# Altium footprint library ThanhNT.PcbLib: 579 footprints (part 19 of 37)
Each footprint in its own frame and in the unit in brackets; x right, y up, seen from the top. Pads: shape width x height; smd on the part's side, far side on the other; paste and mask are expansions set on the pad; w line width, h text height; cw(c..) or ccw(c..) is an arc to the next point about the centre after c.
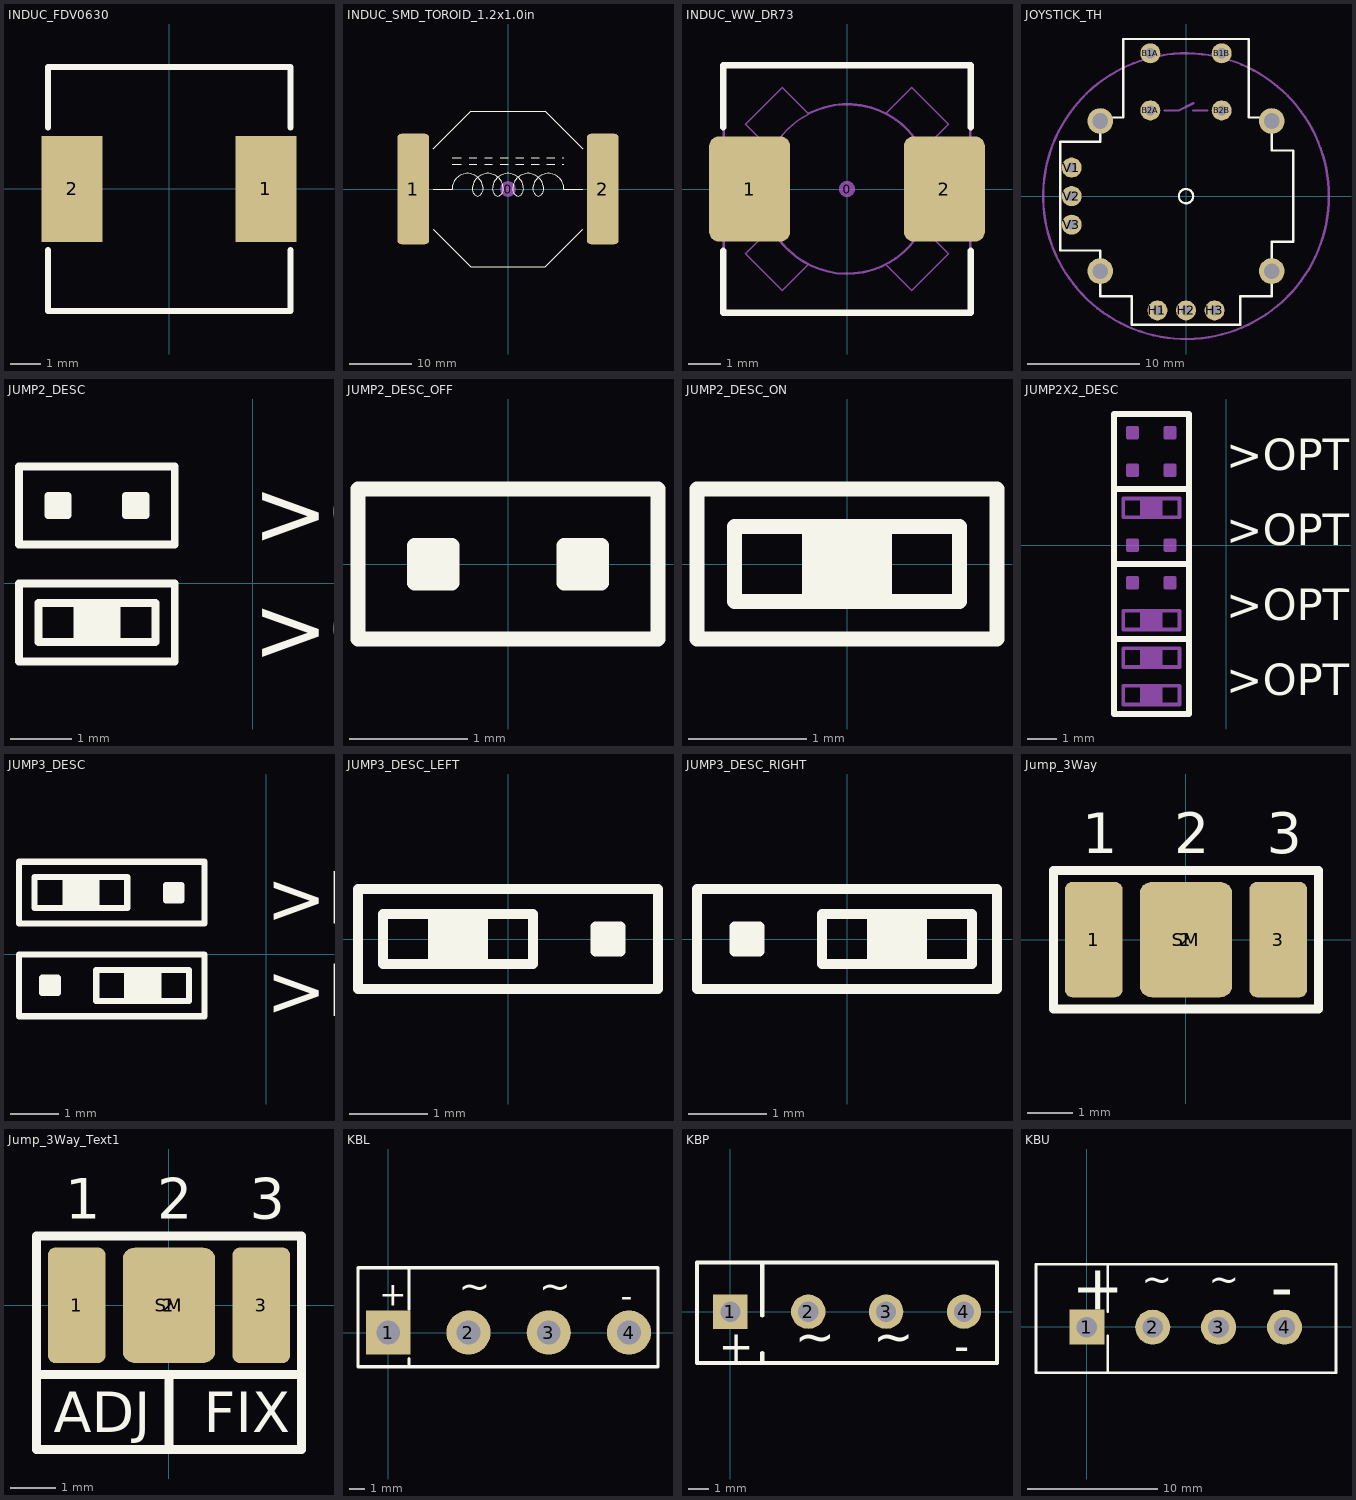
[diagram p18: the footprints below, top view; thin cyan lines are the x and y axes]

## INDUC_FDV0630 [mm]
pads (2):
  rect 2x3.5 smd: 1(3.2,0) 2(-3.2,0)
Top Overlay:
  lines w0.2: -3.997,-2.025 -3.997,-4.025 4.003,-4.025 4.003,-2.025 ; -3.997,2.025 -3.997,4.013 4.003,4.013 4.003,2.025

## INDUC_SMD_TOROID_1.2x1.0in [mm] "Inductor, Toroid, 30.5mm L x 25.4mm W x 13.5mm T"
height 13.5
pads (3):
  round 2.54 on Mech15: 0(0,0)
  rrect25% 5.1x17.8 smd: 1(-15.25,0) 2(15.25,0)
Top Overlay:
  lines w0.2: -12,-6.5 -6,-12.5 6,-12.5 12,-6.5 ; -12,0 -9,0 cw(c-6.5,0) -4,0 cw(c-5.25,0) -4.691,-1.118 cw(c-4.875,0) -5.059,-1.118 cw(c-4.5,0) -5.75,0 cw(c-3.25,0) -0.75,0 cw(c-2,0) -1.441,-1.118 cw(c-1.625,0) -1.809,-1.118 cw(c-1.25,0) -2.5,0 cw(c0,0) 2.5,0 cw(c1.25,0) 1.809,-1.118 cw(c1.625,0) 1.441,-1.118 cw(c2,0) 0.75,0 cw(c3.25,0) 5.75,0 cw(c4.5,0) 5.059,-1.118 cw(c4.875,0) 4.691,-1.118 cw(c5.25,0) 4,0 cw(c6.5,0) 9,0 12,0 ; -12,6.5 -6,12.5 6,12.5 12,6.5 ; -9,4 -7.5,4 ; -9,5 -7.5,5 ; -6.25,4 -5,4 ; -6.25,5 -5,5 ; -3.75,4 -2.5,4 ; -3.75,5 -2.5,5 ; -1.25,4 0,4 ; -1.25,5 0,5 ; 1.25,4 2.5,4 ; 1.25,5 2.5,5 ; 3.75,4 5,4 ; 3.75,5 5,5 ; 6.25,4 7.5,4 ; 6.25,5 7.5,5 ; 8.75,4 9,4 ; 8.75,5 9,5
3D body: height 3.5, standoff 1.5, extent -17,-12.5 17,12.5
3D body: height 12, standoff 5, extent -10,-10 10,10

## INDUC_WW_DR73 [mm] "Wire-wound power inductor, Cooper Bussmann DR73 series, IPC Medium Density"
height 3.55
pads (3):
  round 0.5 on Mech15: 0(0,0)
  rrect25% 2.5x3.25 smd: 1(-3,0) 2(3,0)
Top Overlay:
  lines w0.2: -3.81,-1.905 -3.81,-3.81 3.81,-3.81 3.81,-1.905 ; -3.81,1.905 -3.81,3.81 3.81,3.81 3.81,1.905
Mechanical 13:
  circle w0.05: c0,0 r2.6
  lines w0.05: -2.574,-0.515 -2.574,-0.367 ; -2.574,0.367 -2.574,0.515 ; -2.346,-1.178 -2.346,-1.121 ; -2.346,1.121 -2.346,1.178 ; -2.273,-1.263 -2.334,-1.202 -3.129,-1.998 -1.998,-3.129 -1.202,-2.334 ; -2.273,1.263 -2.334,1.202 ; -2.202,-1.429 -2.184,-1.411 ; -2.202,1.429 -2.184,1.411 ; -1.429,-2.202 -1.411,-2.184 ; -1.263,-2.273 -1.202,-2.334 ; -1.197,-2.308 -1.202,-2.334 ; -0.237,2.589 -0.232,2.615 ; 0.232,-2.615 0.237,-2.589 ; 1.197,2.308 1.202,2.334 ; 1.202,-2.334 1.998,-3.129 3.129,-1.998 2.334,-1.202 2.273,-1.263 ; 1.263,2.273 1.202,2.334 ; 1.411,2.184 1.429,2.202 ; 2.184,-1.411 2.202,-1.429 ; 2.184,1.411 2.202,1.429 ; 2.273,1.263 2.334,1.202 3.129,1.998 1.998,3.129 1.202,2.334 ; 2.574,-0.515 2.574,-0.367 ; 2.574,0.367 2.574,0.515 ; -2.334,1.202 ccw(c0,0) -1.202,2.334 -1.998,3.129 -3.129,1.998 -2.334,1.202 ; -3.8,-3.8 3.8,-3.8 3.8,3.8 -3.8,3.8 -3.8,-3.8
Mechanical 15:
  lines w0.076: -3.8,-3.8 -3.8,3.8 3.8,3.8 3.8,-3.8 -3.8,-3.8
3D body "Cooper Bussman DR73 Series Inductor.STEP": height 3.55, standoff 0, extent -3.8,-3.8 3.8,3.8

## JOYSTICK_TH [mil]
pads (14):
  round 70 hole 36: B1A(-125,500) B1B(125,500) B2A(-125,300) B2B(125,300)
  round 70 hole 35: H1(-100,-400) H2(0,-400) H3(100,-400) V1(-400,100) V2(-400,0) V3(-400,-100)
  round 90 hole 55: MOUNT1(-300,263) MOUNT2(-300,-262.5) MOUNT3(300,-262.5) MOUNT4(300,263)
Top Overlay:
  circle w7.87: c0,0 r25
  lines w7.87: -440,-190 -300,-190 -300,-350 -190,-350 -190,-450 190,-450 190,-350 300,-350 300,-160 375,-160 375,160 300,160 300,275 220,275 220,550 -220,550 -220,275 -300,275 -300,190 -440,190 -440,-190
Mechanical 16:
  circle w8: c0,0 r500
  lines w8: -75,300 -25,300 25,325 ; 25,300 75,300
3D body "User Library-ALPS JOYSTICK.STEP": height 111.55, standoff -1218.58, extent -520,-518.58 515.43,624.58

## JUMP2_DESC [mm]
Top Overlay:
  lines w0.127: -3.334,1.143 -3.334,1.27 ; -3.334,1.143 -3.016,1.143 ; -3.334,1.143 -3.334,1.111 -3.016,1.111 -3.016,1.143 ; -3.334,1.27 -3.016,1.27 ; -3.334,1.27 -3.334,1.397 ; -3.334,1.397 -3.016,1.397 ; -3.334,1.397 -3.334,1.429 -3.016,1.429 -3.016,1.397 ; -3.016,1.143 -3.016,1.27 ; -3.016,1.27 -3.016,1.397 ; -2.857,-0.889 -2.222,-0.889 ; -2.857,-0.889 -2.857,-0.762 ; -2.857,-0.889 -2.857,-0.953 -2.222,-0.953 -2.222,-0.889 ; -2.857,-0.762 -2.857,-0.635 ; -2.857,-0.762 -2.222,-0.762 ; -2.857,-0.635 -2.222,-0.635 ; -2.857,-0.635 -2.857,-0.508 ; -2.857,-0.508 -2.222,-0.508 ; -2.857,-0.508 -2.857,-0.381 ; -2.857,-0.381 -2.222,-0.381 ; -2.857,-0.381 -2.857,-0.318 -2.222,-0.318 -2.222,-0.381 ; -2.222,-0.889 -2.222,-0.762 ; -2.222,-0.762 -2.222,-0.635 ; -2.222,-0.635 -2.222,-0.508 ; -2.222,-0.508 -2.222,-0.381 ; -2.064,1.143 -2.064,1.27 ; -2.064,1.143 -1.746,1.143 ; -2.064,1.143 -2.064,1.111 -1.746,1.111 -1.746,1.143 ; -2.064,1.27 -1.746,1.27 ; -2.064,1.27 -2.064,1.397 ; -2.064,1.397 -1.746,1.397 ; -2.064,1.397 -2.064,1.429 -1.746,1.429 -1.746,1.397 ; -1.746,1.143 -1.746,1.27 ; -1.746,1.27 -1.746,1.397 ; -3.81,-1.27 -1.27,-1.27 -1.27,0 -3.81,0 -3.81,-1.27 ; -3.81,0.635 -3.81,1.905 -1.27,1.905 -1.27,0.635 -3.81,0.635 ; -3.492,-0.953 -1.587,-0.953 -1.587,-0.318 -3.492,-0.318 -3.492,-0.953
  text ">OFF" at 0,0.635 h1.08
  text ">ON" at 0,-1.27 h1.08

## JUMP2_DESC_OFF [mm]
Top Overlay:
  lines w0.127: -0.794,-0.127 -0.794,0 ; -0.794,-0.127 -0.476,-0.127 ; -0.794,-0.127 -0.794,-0.159 -0.476,-0.159 -0.476,-0.127 ; -0.794,0 -0.476,0 ; -0.794,0 -0.794,0.127 ; -0.794,0.127 -0.476,0.127 ; -0.794,0.127 -0.794,0.159 -0.476,0.159 -0.476,0.127 ; -0.476,-0.127 -0.476,0 ; -0.476,0 -0.476,0.127 ; 0.476,-0.127 0.476,0 ; 0.476,-0.127 0.794,-0.127 ; 0.476,-0.127 0.476,-0.159 0.794,-0.159 0.794,-0.127 ; 0.476,0 0.794,0 ; 0.476,0 0.476,0.127 ; 0.476,0.127 0.794,0.127 ; 0.476,0.127 0.476,0.159 0.794,0.159 0.794,0.127 ; 0.794,-0.127 0.794,0 ; 0.794,0 0.794,0.127 ; -1.27,-0.635 -1.27,0.635 1.27,0.635 1.27,-0.635 -1.27,-0.635

## JUMP2_DESC_ON [mm]
Top Overlay:
  lines w0.127: -0.318,-0.254 0.318,-0.254 ; -0.318,-0.254 -0.318,-0.127 ; -0.318,-0.254 -0.318,-0.318 0.318,-0.318 0.318,-0.254 ; -0.318,-0.127 -0.318,0 ; -0.318,-0.127 0.318,-0.127 ; -0.318,0 0.318,0 ; -0.318,0 -0.318,0.127 ; -0.318,0.127 0.318,0.127 ; -0.318,0.127 -0.318,0.254 ; -0.318,0.254 0.318,0.254 ; -0.318,0.254 -0.318,0.318 0.318,0.318 0.318,0.254 ; 0.318,-0.254 0.318,-0.127 ; 0.318,-0.127 0.318,0 ; 0.318,0 0.318,0.127 ; 0.318,0.127 0.318,0.254 ; -1.27,-0.635 1.27,-0.635 1.27,0.635 -1.27,0.635 -1.27,-0.635 ; -0.953,-0.318 0.953,-0.318 0.953,0.318 -0.953,0.318 -0.953,-0.318

## JUMP2X2_DESC [mm]
Top Overlay:
  lines w0.2: -3.81,-3.175 -3.81,-0.635 ; -3.81,-3.175 -1.27,-3.175 ; -3.81,-3.175 -3.81,-5.715 -1.27,-5.715 -1.27,-3.175 ; -3.81,-0.635 -3.81,1.905 ; -3.81,-0.635 -1.27,-0.635 ; -3.81,1.905 -3.81,4.445 -1.27,4.445 -1.27,1.905 ; -3.81,1.905 -1.27,1.905 ; -1.27,-3.175 -1.27,-0.635 ; -1.27,-0.635 -1.27,1.905
  text ">OPT1" at 0,2.54 h1.08
  text ">OPT2" at 0,0 h1.08
  text ">OPT3" at 0,-2.54 h1.08
  text ">OPT4" at 0,-5.08 h1.08
Mechanical 16:
  drawing of 196 lines, arcs and shapes, not listed

## JUMP3_DESC [mm]
Top Overlay:
  lines w0.127: -4.604,-0.762 -4.604,-0.794 -4.286,-0.794 -4.286,-0.762 ; -4.604,-0.762 -4.286,-0.762 ; -4.604,-0.762 -4.604,-0.635 ; -4.604,-0.635 -4.604,-0.508 ; -4.604,-0.635 -4.286,-0.635 ; -4.604,-0.508 -4.604,-0.476 -4.286,-0.476 -4.286,-0.508 ; -4.604,-0.508 -4.286,-0.508 ; -4.286,-0.762 -4.286,-0.635 ; -4.286,-0.635 -4.286,-0.508 ; -4.127,1.016 -4.127,0.953 -3.492,0.953 -3.492,1.016 ; -4.127,1.016 -4.127,1.143 ; -4.127,1.016 -3.492,1.016 ; -4.127,1.143 -3.492,1.143 ; -4.127,1.143 -4.127,1.27 ; -4.127,1.27 -4.127,1.397 ; -4.127,1.27 -3.492,1.27 ; -4.127,1.397 -4.127,1.524 ; -4.127,1.397 -3.492,1.397 ; -4.127,1.524 -4.127,1.587 -3.492,1.587 -3.492,1.524 ; -4.127,1.524 -3.492,1.524 ; -3.492,1.016 -3.492,1.143 ; -3.492,1.143 -3.492,1.27 ; -3.492,1.27 -3.492,1.397 ; -3.492,1.397 -3.492,1.524 ; -2.857,-0.889 -2.857,-0.953 -2.222,-0.953 -2.222,-0.889 ; -2.857,-0.889 -2.857,-0.762 ; -2.857,-0.889 -2.222,-0.889 ; -2.857,-0.762 -2.222,-0.762 ; -2.857,-0.762 -2.857,-0.635 ; -2.857,-0.635 -2.857,-0.508 ; -2.857,-0.635 -2.222,-0.635 ; -2.857,-0.508 -2.857,-0.381 ; -2.857,-0.508 -2.222,-0.508 ; -2.857,-0.381 -2.857,-0.318 -2.222,-0.318 -2.222,-0.381 ; -2.857,-0.381 -2.222,-0.381 ; -2.222,-0.889 -2.222,-0.762 ; -2.222,-0.762 -2.222,-0.635 ; -2.222,-0.635 -2.222,-0.508 ; -2.222,-0.508 -2.222,-0.381 ; -2.064,1.143 -2.064,1.111 -1.746,1.111 -1.746,1.143 ; -2.064,1.143 -1.746,1.143 ; -2.064,1.143 -2.064,1.27 ; -2.064,1.27 -2.064,1.397 ; -2.064,1.27 -1.746,1.27 ; -2.064,1.397 -2.064,1.429 -1.746,1.429 -1.746,1.397 ; -2.064,1.397 -1.746,1.397 ; -1.746,1.143 -1.746,1.27 ; -1.746,1.27 -1.746,1.397 ; -5.08,-1.27 -5.08,0 -1.27,0 -1.27,-1.27 -5.08,-1.27 ; -5.08,0.635 -1.27,0.635 -1.27,1.905 -5.08,1.905 -5.08,0.635 ; -4.763,0.953 -2.857,0.953 -2.857,1.587 -4.763,1.587 -4.763,0.953 ; -3.492,-0.953 -3.492,-0.318 -1.587,-0.318 -1.587,-0.953 -3.492,-0.953
  text ">RIGHT" at 0,-1.27 h1.08
  text ">LEFT" at 0,0.635 h1.08

## JUMP3_DESC_LEFT [mm]
Top Overlay:
  lines w0.127: -0.953,-0.254 -0.953,-0.318 -0.318,-0.318 -0.318,-0.254 ; -0.953,-0.254 -0.953,-0.127 ; -0.953,-0.254 -0.318,-0.254 ; -0.953,-0.127 -0.318,-0.127 ; -0.953,-0.127 -0.953,0 ; -0.953,0 -0.953,0.127 ; -0.953,0 -0.318,0 ; -0.953,0.127 -0.953,0.254 ; -0.953,0.127 -0.318,0.127 ; -0.953,0.254 -0.953,0.318 -0.318,0.318 -0.318,0.254 ; -0.953,0.254 -0.318,0.254 ; -0.318,-0.254 -0.318,-0.127 ; -0.318,-0.127 -0.318,0 ; -0.318,0 -0.318,0.127 ; -0.318,0.127 -0.318,0.254 ; 1.111,-0.127 1.111,-0.159 1.429,-0.159 1.429,-0.127 ; 1.111,-0.127 1.429,-0.127 ; 1.111,-0.127 1.111,0 ; 1.111,0 1.111,0.127 ; 1.111,0 1.429,0 ; 1.111,0.127 1.111,0.159 1.429,0.159 1.429,0.127 ; 1.111,0.127 1.429,0.127 ; 1.429,-0.127 1.429,0 ; 1.429,0 1.429,0.127 ; -1.905,-0.635 1.905,-0.635 1.905,0.635 -1.905,0.635 -1.905,-0.635 ; -1.587,-0.318 0.318,-0.318 0.318,0.318 -1.587,0.318 -1.587,-0.318

## JUMP3_DESC_RIGHT [mm]
Top Overlay:
  lines w0.127: -1.429,-0.127 -1.429,-0.159 -1.111,-0.159 -1.111,-0.127 ; -1.429,-0.127 -1.111,-0.127 ; -1.429,-0.127 -1.429,0 ; -1.429,0 -1.429,0.127 ; -1.429,0 -1.111,0 ; -1.429,0.127 -1.429,0.159 -1.111,0.159 -1.111,0.127 ; -1.429,0.127 -1.111,0.127 ; -1.111,-0.127 -1.111,0 ; -1.111,0 -1.111,0.127 ; 0.318,-0.254 0.318,-0.318 0.953,-0.318 0.953,-0.254 ; 0.318,-0.254 0.318,-0.127 ; 0.318,-0.254 0.953,-0.254 ; 0.318,-0.127 0.953,-0.127 ; 0.318,-0.127 0.318,0 ; 0.318,0 0.318,0.127 ; 0.318,0 0.953,0 ; 0.318,0.127 0.318,0.254 ; 0.318,0.127 0.953,0.127 ; 0.318,0.254 0.318,0.318 0.953,0.318 0.953,0.254 ; 0.318,0.254 0.953,0.254 ; 0.953,-0.254 0.953,-0.127 ; 0.953,-0.127 0.953,0 ; 0.953,0 0.953,0.127 ; 0.953,0.127 0.953,0.254 ; -1.905,-0.635 -1.905,0.635 1.905,0.635 1.905,-0.635 -1.905,-0.635 ; -0.318,-0.318 -0.318,0.318 1.587,0.318 1.587,-0.318 -0.318,-0.318

## Jump_3Way [mil] "SMT Battery jumper pads"
pads (4):
  rrect25% 50x100 smd: 1(-80,0) 3(80,0)
  rrect25% 80x100 smd: 2(0,0)
  rrect25% 218x108 on Top Solder: SM(0,0)
Top Overlay:
  lines w7.87: -115,-60 115,-60 115,60 -115,60 -115,-60
  text "3" at 70,75 h35
  text "2" at -10,75 h35
  text "1" at -90,75 h35
Mechanical 13:
  lines w3: -115,-60 115,-60 115,60 -115,60 -115,-60

## Jump_3Way_Text1 [mil] "SMT jumper for fixed or variable"
pads (4):
  rrect25% 50x100 smd: 1(-80,0) 3(80,0)
  rrect25% 80x100 smd: 2(0,0)
  rrect25% 218x108 on Top Solder: SM(0,0)
Top Overlay:
  lines w7.87: 0,-125 0,-60 ; -115,-60 115,-60 ; -115,-60 -115,60 115,60 115,-60 ; -115,-60 -115,-125 115,-125 115,-60
  text "3" at 70,75 h35
  text "2" at -10,75 h35
  text "1" at -90,75 h35
  text "ADJ" at -100,-110 h35
  text "FIX" at 30,-110 h35
Mechanical 13:
  lines w3: -115,-60 115,-60 115,60 -115,60 -115,-60

## KBL [mil] "BRIDGE RECTIFIERS"
height 800
pads (4):
  rect 110x110 hole 59.06: 1(0,0)
  round 110 hole 59.06: 2(199.33,0) 3(398.67,0) 4(598,0)
Top Overlay:
  lines w7.87: 52,-85 52,-65 ; 52,58 52,161 ; -75,-85 670,-85 670,161 -75,161 -75,-85
  text "~" at 375,59 h118.11
  text "~" at 175,59 h118.11
  text "-" at 578,63.01 h60
  text "+" at -22,67 h60
3D body "User Library-KBL-1.STEP": height 620.08, standoff -177.17, extent -75.02,-85.08 673.02,161

## KBP [mm] "BRIDGE RECTIFIERS"
height 20.32
pads (4):
  rect 1.7x1.7 hole 1: 1(0,0)
  round 1.7 hole 1: 2(3.85,0) 3(7.7,0) 4(11.55,0)
Top Overlay:
  lines w0.2: -1.651,2.388 -1.651,-2.54 13.183,-2.54 13.183,2.413 ; -1.651,2.438 13.183,2.438 ; 1.575,-2.54 1.575,-2.032 ; 1.575,-0.178 1.575,2.438
  text "~" at 7.061,-2.667 h3
  text "~" at 3.175,-2.667 h3
  text "-" at 11.074,-2.446 h1.52
  text "+" at -0.584,-2.438 h1.52
3D body "User Library-KBP.STEP": height 12.19, standoff -3.5, extent -1.599,-2.44 13.131,2.385

## KBU [mm] "BRIDGE RECTIFIERS"
height 20.32
pads (4):
  rect 2.7x2.7 hole 1.6: 1(0,-0.051)
  round 2.7 hole 1.6: 2(5.072,-0.051) 3(10.143,-0.051) 4(15.215,-0.051)
Top Overlay:
  lines w0.2: 1.6,-3.531 1.6,-0.711 ; 1.6,1.143 1.6,4.699 ; -3.912,-3.556 -3.912,4.801 19.177,4.801 19.177,-3.556 -3.912,-3.556
  text "+" at -1.168,1.295 h3.5
  text "-" at 14.173,1.336 h3.5
  text "~" at 4.216,1.981 h3.5
  text "~" at 9.398,1.981 h3.5
3D body "User Library-KBU.STEP": height 19.3, standoff -4.5, extent -4.006,-3.601 19.194,4.899